# Altium footprint library Misc.PCBLIB: 128 footprints (part 6 of 8)
Each footprint in its own frame and in the unit in brackets; x right, y up, seen from the top. Pads: shape width x height; smd on the part's side, far side on the other; paste and mask are expansions set on the pad; w line width, h text height; cw(c..) or ccw(c..) is an arc to the next point about the centre after c.
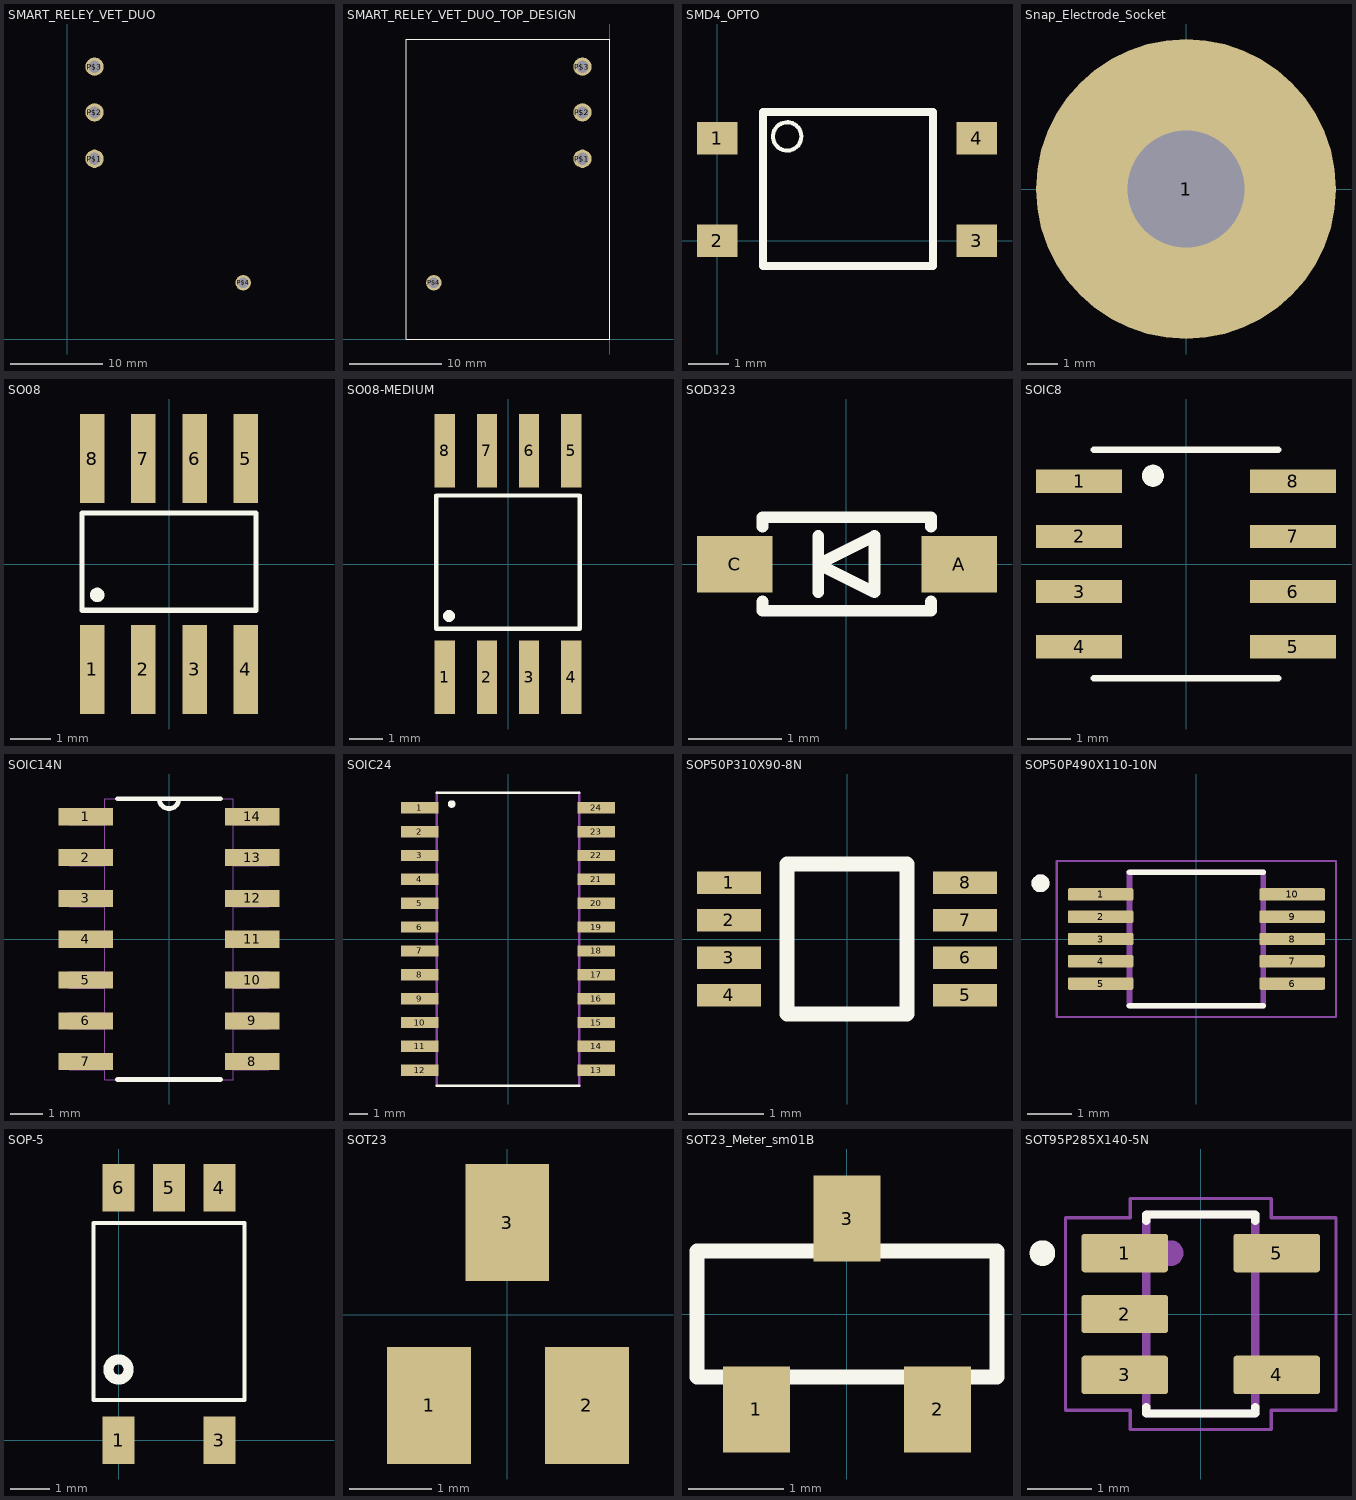
[diagram p5: the footprints below, top view; thin cyan lines are the x and y axes]

## SMART_RELEY_VET_DUO [mil]
pads (4):
  round 78 hole 52: P$1(117,769) P$2(117,967) P$3(117,1162)
  round 66 hole 44: P$4(751,240)
Bottom Overlay:
  lines w5: 0,0 0,1280 869,1280 869,0 0,0

## SMART_RELEY_VET_DUO_TOP_DESIGN [mil]
pads (4):
  round 78 hole 52: P$1(-117,769) P$2(-117,967) P$3(-117,1162)
  round 66 hole 44: P$4(-751,240)
Top Overlay:
  lines w5: -869,0 0,0 0,1280 -869,1280 -869,0

## SMD4_OPTO [mil]
pads (4):
  rect 40x32 smd: 1(0,101) 2(0,0) 3(256,0) 4(256,101)
Top Overlay:
  circle w4: c69,103 r14
  lines w8: 45,-24.78 213,-24.78 213,127 45,127 45,-24.78

## Snap_Electrode_Socket [mm]
pads (1):
  round 10 hole 3.9: 1(0,0)

## SO08 [mil]
pads (8):
  rect 24x87 smd: 1(-75,-102.84) 2(-25,-102.84) 3(25,-102.84) 4(75,-102.84) 5(75,102.84) 6(25,102.84) 7(-25,102.84) 8(-75,102.84)
Top Overlay:
  circle w12: c-70,-30.16 r1
  lines w5: -85,-45.16 -85,49.84 85,49.84 85,-45.16 -85,-45.16
3D body "SO-8.step": height 57, standoff 0, extent -96.99,-113.08 96,114.41

## SO08-MEDIUM [mil]
pads (8):
  rect 24x87 smd: 1(-75,-134.34) 2(-25,-134.34) 3(25,-134.34) 4(75,-134.34) 5(75,134.34) 6(25,134.34) 7(-25,134.34) 8(-75,134.34)
Top Overlay:
  circle w12: c-70,-61.66 r1
  lines w5: -85,-76.66 -85,81.34 85,81.34 85,-76.66 -85,-76.66
3D body "User Library-SOIC8_(ATTINY12).step": height 90.55, standoff -0.78, extent -105.54,-168.45 106.27,161.97

## SOD323 [mil]
pads (2):
  rect 32x24 smd: A(48,0) C(-47.24,0)
Top Overlay:
  lines w5: -35.43,-15.75 -35.43,-19.68 36,-19.68 36,-15.75 ; -35.43,16 -35.43,20 36,20 36,16 ; -11.81,-11.81 -11.81,0 ; -11.81,12 -11.81,0 ; -11.81,0 12,12 12,-11.81 -11.81,0
3D body "User Library-SOD323-1.step": height 43.31, standoff 0, extent -51.18,-26.57 51.18,26.58

## SOIC8 [mil]
pads (8):
  rect 78x21 smd: 1(-97,75) 2(-97,25) 3(-97,-25) 4(-97,-75) 5(97,-75) 6(97,-25) 7(97,25) 8(97,75)
Top Overlay:
  circle w10: c-30,80 r5
  lines w6: -83.5,-103.5 83.5,-103.5 ; -83.5,103.5 83.5,103.5
3D body "21-0041B_8.step": height 69.09, standoff 0, extent -122,-98.5 122.01,98.51

## SOIC14N [mil]
pads (14):
  rect 67x21 smd: 1(-102,150) 2(-102,100) 3(-102,50) 4(-102,0) 5(-102,-50) 6(-102,-100) 7(-102,-150) 8(102,-150) 9(102,-100) 10(102,-50) 11(102,0) 12(102,50) 13(102,100) 14(102,150)
Top Overlay:
  lines w6: -63,-172 63,-172 ; -63,172 -12,172 ; 63,172 12,172 ; -12,172 ccw(c0,172) 12,172 ; -12,172 12,172
Mechanical 13:
  lines w0: -12,172 ccw(c0,172) 12,172 ; -12,172 -79,172 -79,-172 79,-172 79,172 12,172 ; -12,172 12,172 ; -122,-160 -79,-160 -79,-140 -122,-140 -122,-160 ; -122,-110 -79,-110 -79,-90 -122,-90 -122,-110 ; -122,-60 -79,-60 -79,-40 -122,-40 -122,-60 ; -122,-10 -79,-10 -79,10 -122,10 -122,-10 ; -122,40 -79,40 -79,60 -122,60 -122,40 ; -122,90 -79,90 -79,110 -122,110 -122,90 ; -122,140 -79,140 -79,160 -122,160 -122,140 ; 79,-160 122,-160 122,-140 79,-140 79,-160 ; 79,-110 122,-110 122,-90 79,-90 79,-110 ; 79,-60 122,-60 122,-40 79,-40 79,-60 ; 79,-10 122,-10 122,10 79,10 79,-10 ; 79,40 122,40 122,60 79,60 79,40 ; 79,90 122,90 122,110 79,110 79,90 ; 79,140 122,140 122,160 79,160 79,140

## SOIC24 [mm]
pads (24):
  rect 2x0.6 smd: 1(-4.7,7) 2(-4.7,5.73) 3(-4.7,4.46) 4(-4.7,3.19) 5(-4.7,1.92) 6(-4.7,0.65) 7(-4.7,-0.62) 8(-4.7,-1.89) 9(-4.7,-3.16) 10(-4.7,-4.43) 11(-4.7,-5.7) 12(-4.7,-6.97) 13(4.7,-6.97) 14(4.7,-5.7) 15(4.7,-4.43) 16(4.7,-3.16) 17(4.7,-1.89) 18(4.7,-0.62) 19(4.7,0.65) 20(4.7,1.92) 21(4.7,3.19) 22(4.7,4.46) 23(4.7,5.73) 24(4.7,7)
Top Overlay:
  circle w0.2: c-3,7.2 r0.1
  lines w0.127: -3.8,-7.8 3.8,-7.8 ; -3.8,7.8 3.8,7.8
Mechanical 4:
  lines w0.127: -3.8,-7.8 -3.8,7.8 -3.8,-7.8 ; 3.8,-7.8 3.8,7.8 3.8,-7.8

## SOP50P310X90-8N [mm]
pads (8):
  rect 0.85x0.3 smd: 1(-1.575,0.75) 2(-1.575,0.25) 3(-1.575,-0.25) 4(-1.575,-0.75) 5(1.575,-0.75) 6(1.575,-0.25) 7(1.575,0.25) 8(1.575,0.75)
Top Overlay:
  lines w0.2: -0.8,-1 0.8,-1 0.8,1 -0.8,1 -0.8,-1
3D body "NL27WZ126USG.stp": height 0.9, standoff 0, extent -1.55,-1 1.55,1

## SOP50P490X110-10N [mm]
pads (10):
  rrect25% 1.47x0.28 smd: 1(-2.15,1) 2(-2.15,0.5) 3(-2.15,0) 4(-2.15,-0.5) 5(-2.15,-1) 6(2.15,-1) 7(2.15,-0.5) 8(2.15,0) 9(2.15,0.5) 10(2.15,1)
Top Overlay:
  circle w0.2: c-3.5,1.25 r0.1
  lines w0.127: -1.5,-1.5 1.5,-1.5 ; -1.5,1.5 1.5,1.5
Mechanical 13:
  circle w0.2: c-3.5,1.25 r0.1
  lines w0.127: -1.5,-1.5 -1.5,1.5 1.5,1.5 1.5,-1.5 -1.5,-1.5
Mechanical 15:
  lines w0.05: -3.135,-1.75 -3.135,1.75 3.135,1.75 3.135,-1.75 -3.135,-1.75
3D body "ADS1115IDGST.STEP": height 1.1, standoff 0, extent -2.45,-1.5 2.45,1.5

## SOP-5 [mm]
pads (5):
  rect 0.8x1.2 smd: 1(0,0) 3(2.54,0) 4(2.54,6.35) 5(1.27,6.35) 6(0,6.35)
Top Overlay:
  circle w0.254: c0,1.778 r0.254
  lines w0.1: -0.635,1.016 3.175,1.016 3.175,5.461 -0.635,5.461 -0.635,1.016
3D body "User Library-SO-6_Stretched v3.step": height 3.18, standoff 0.01, extent -1.02,-0.367 3.56,6.833

## SOT23 [mil]
pads (3):
  rect 40x56 smd: 1(-37.4,-43.31) 2(38,-43.31) 3(0,44)
3D body "CircuitWorks-SOT-23.step": height 41.34, standoff -1.97, extent -59.06,-49.21 59.06,49.21

## SOT23_Meter_sm01B [mm]
pads (3):
  rect 0.7x0.9 smd mask-0.45: 1(-0.95,-1) 2(0.95,-1) 3(0,1)
Top Overlay:
  lines w0.152: -1.573,-0.66 1.573,-0.66 1.573,0.66 -1.573,0.66 -1.573,-0.66
Top Solder:
  region: -1.25,-1.35 -1.25,-0.65 -0.65,-0.65 -0.65,-1.35
  region: 0.65,-1.35 0.65,-0.65 1.25,-0.65 1.25,-1.35
  region: -0.3,0.65 -0.3,1.35 0.3,1.35 0.3,0.65
3D body "CircuitWorks-SOT-23.step": height 1.05, standoff -0.05, extent -1.513,-1.352 1.487,1.148

## SOT95P285X140-5N [mm]
pads (5):
  rrect15% 1.35x0.6 smd: 1(-1.185,0.95) 2(-1.185,0) 3(-1.185,-0.95) 4(1.185,-0.95) 5(1.185,0.95)
Top Overlay:
  circle w0.2: c-2.469,0.95 r0.1
  lines w0.127: -0.85,-1.45 -0.85,-1.55 0.85,-1.55 0.85,-1.45 ; -0.85,1.45 -0.85,1.55 0.85,1.55 0.85,1.45
Mechanical 13:
  circle w0.2: c-0.469,0.95 r0.1
  lines w0.127: -0.85,-1.55 0.85,-1.55 0.85,1.55 -0.85,1.55 -0.85,-1.55
Mechanical 15:
  lines w0.05: -2.11,-1.5 -2.11,1.5 -1.1,1.5 -1.1,1.8 1.1,1.8 1.1,1.5 2.11,1.5 2.11,-1.5 1.1,-1.5 1.1,-1.8 -1.1,-1.8 -1.1,-1.5 -2.11,-1.5
3D body "step_temp.STEP": height 1.4, standoff 0, extent -1.4,-1.5 1.4,1.5